# Altium footprint library PcbLib_ICs.PcbLib: 317 footprints (part 19 of 24)
Each footprint in its own frame and in the unit in brackets; x right, y up, seen from the top. Pads: shape width x height; smd on the part's side, far side on the other; paste and mask are expansions set on the pad; w line width, h text height; cw(c..) or ccw(c..) is an arc to the next point about the centre after c.
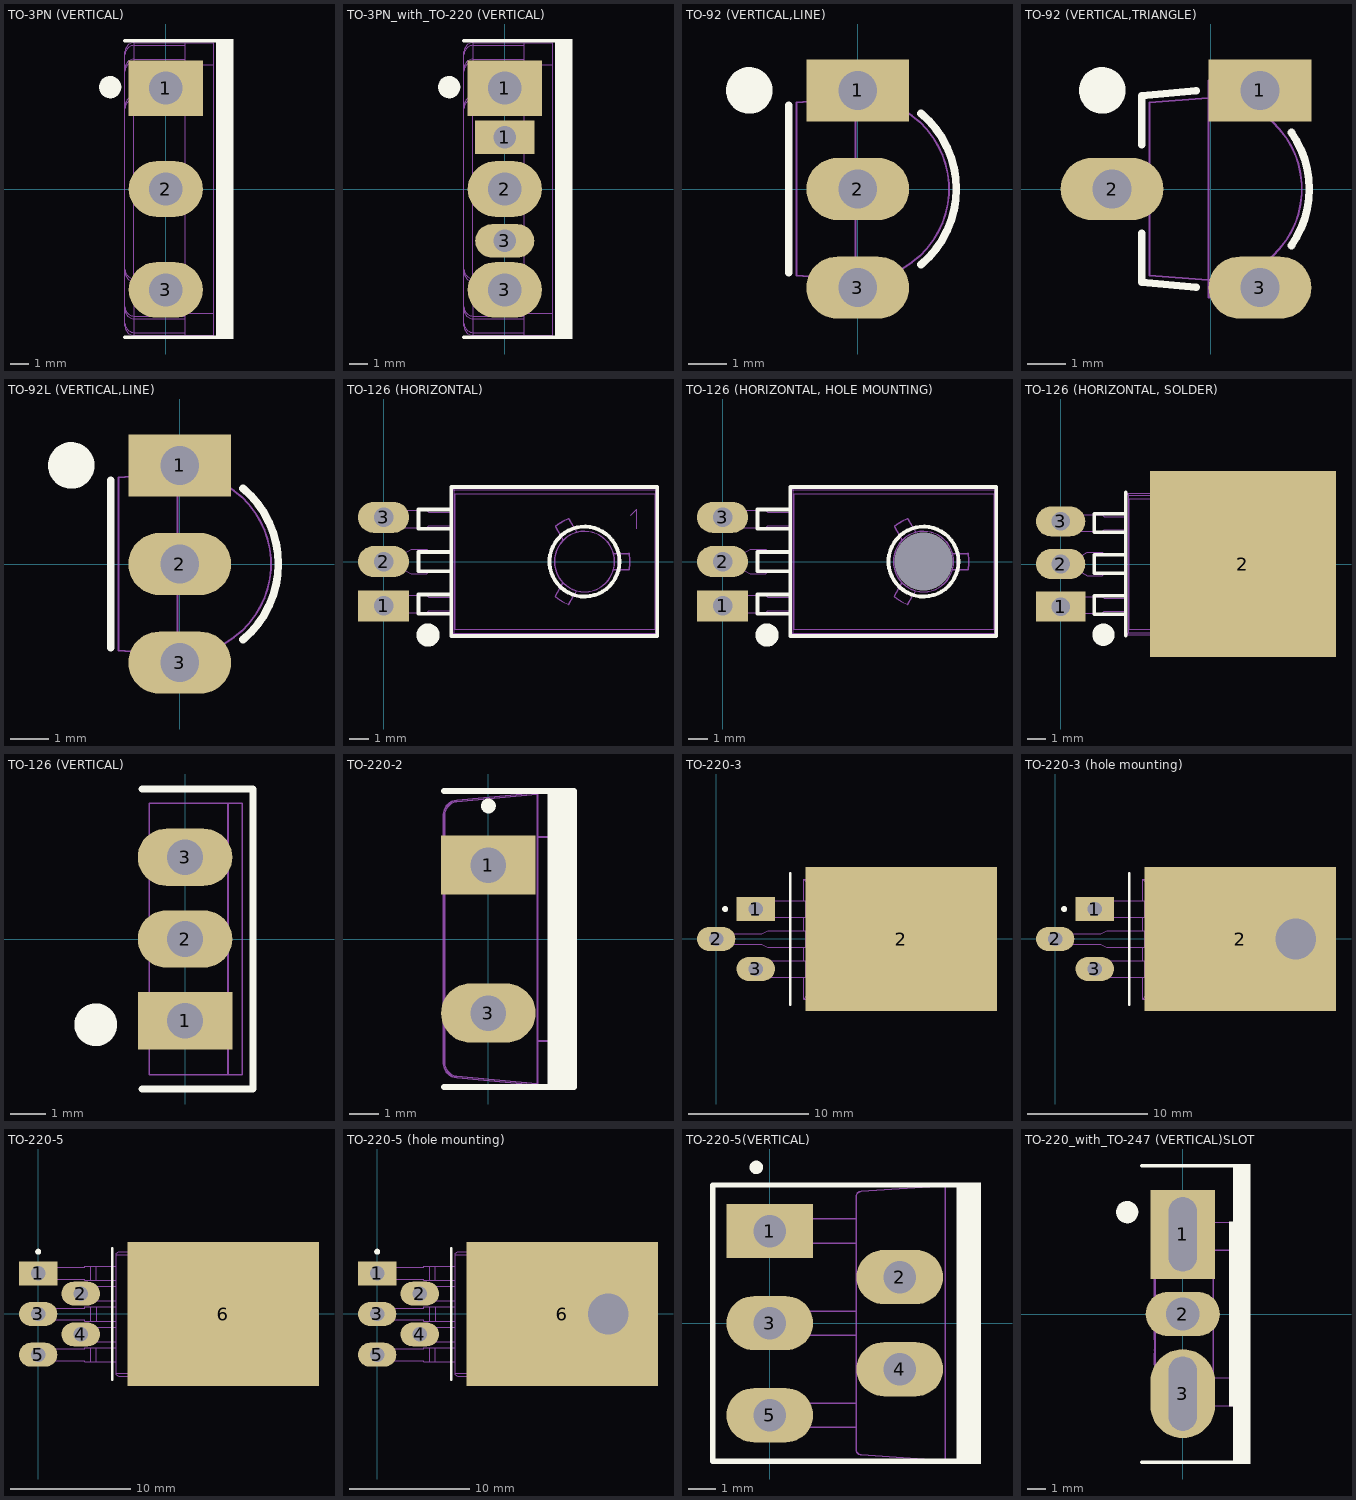
[diagram p18: the footprints below, top view; thin cyan lines are the x and y axes]

## TO-3PN (VERTICAL) [mm]
height 4.57
pads (3):
  rect 4x3 hole 1.8: 1(0,5.45)
  oval 4x3 hole 1.8: 2(0,0) 3(0,-5.45)
Top Overlay:
  circle w0.6: c-3,5.5 r0.3
  rectangle: 2.8,-8.1 3.65,8.1
  lines w0.2: -2.2,-8 2.8,-8 2.8,8 -2.2,8
Top Assy:
  lines w0.05: -2.201,-7.249 ccw(c-1.701,-7.249) -1.701,-7.749 ; -2.201,-6.506 ccw(c-1.701,-6.506) -1.701,-7.006 ; -2.201,-6.364 ccw(c-1.701,-6.364) -1.701,-6.864 ; -2.201,-4.484 ccw(c-1.701,-4.484) -1.701,-4.984 ; -2.201,-4.342 ccw(c-1.701,-4.342) -1.701,-4.842 ; -2.201,4.344 cw(c-1.701,4.344) -1.701,4.844 ; -2.201,4.486 cw(c-1.701,4.486) -1.701,4.986 ; -2.201,6.358 cw(c-1.701,6.358) -1.701,6.858 ; -2.201,6.508 cw(c-1.701,6.508) -1.701,7.008 ; -2.201,7.251 cw(c-1.701,7.251) -1.701,7.751 ; -1.727,-4.983 cw(c-0.408,-4.912) -1.727,-4.842 -1.727,4.844 cw(c-0.408,4.914) -1.727,4.985 ; 1.049,-7.749 -1.701,-7.749 ; 1.049,-7.006 -1.701,-7.006 ; 1.049,-6.864 -1.701,-6.864 ; 1.049,-4.934 -1.701,-4.984 ; 1.049,-4.792 -1.709,-4.842 ccw(c-0.384,-4.84) -1.701,-4.984 ; 1.049,4.794 -1.709,4.844 cw(c-0.384,4.842) -1.701,4.986 ; 1.049,4.936 -1.701,4.986 ; 1.049,6.866 -1.701,6.866 ; 1.049,7.008 -1.701,7.008 ; 1.049,7.751 -1.701,7.751 ; 2.599,-7.898 2.6,-7.898 2.6,-6.799 ; 2.599,-6.799 2.6,-6.799 ; 2.599,-3.499 2.6,-3.499 ; 2.599,3.501 2.6,3.501 ; 2.599,6.801 2.6,6.801 ; 2.599,7.9 2.6,7.9 2.6,6.801 ; -1.701,-7.899 cw(c-1.701,-7.399) -2.201,-7.399 -2.201,-6.543 -2.201,-4.592 -2.201,4.594 -2.201,6.545 -2.201,7.401 cw(c-1.701,7.401) -1.701,7.901 ; -1.701,-7.899 1.049,-7.899 ; -1.701,-7.899 -1.701,-7.749 ; -1.701,-7.749 -1.701,-7.006 ; -1.701,-7.006 -1.701,-6.864 ; -1.701,-6.864 -1.701,-4.984 ; -1.701,4.986 -1.701,6.866 ; -1.701,6.866 -1.701,7.008 ; -1.701,7.008 -1.701,7.751 ; -1.701,7.751 -1.701,7.901 ; -1.701,7.901 1.049,7.901 ; 1.049,-7.899 1.049,-6.699 ; 1.049,-7.899 2.599,-7.899 2.599,-6.699 ; 1.049,-6.699 1.049,6.701 ; 1.049,-6.699 2.599,-6.699 ; 1.049,6.701 1.049,7.901 ; 1.049,6.701 2.599,6.701 ; 1.049,7.901 2.599,7.901 2.599,6.701 ; 2.599,-6.699 2.599,6.701 ; 2.6,-6.799 2.6,-3.499 ; 2.6,-3.499 2.6,3.501 ; 2.6,3.501 2.6,6.801
  text ".Designator" at -4.2,5.162 h3
3D body "TO-3PN_2.STEP": height 29.9, standoff -3.5, extent -2.2,-7.9 2.601,7.9

## TO-3PN_with_TO-220 (VERTICAL) [mm]
height 4.57
pads (5):
  rect 3.2x1.8 hole 1.2: 1(0,2.8)
  rect 4x3 hole 1.8: 1(0,5.45)
  oval 4x3 hole 1.8: 2(0,0) 3(0,-5.45)
  oval 3.2x1.8 hole 1.2: 3(0,-2.8)
Top Overlay:
  circle w0.6: c-3,5.5 r0.3
  rectangle: 2.8,-8.1 3.65,8.1
  lines w0.2: -2.2,-8 2.8,-8 2.8,8 -2.2,8
Top Assy:
  lines w0.05: -2.201,-7.249 ccw(c-1.701,-7.249) -1.701,-7.749 ; -2.201,-6.506 ccw(c-1.701,-6.506) -1.701,-7.006 ; -2.201,-6.364 ccw(c-1.701,-6.364) -1.701,-6.864 ; -2.201,-4.484 ccw(c-1.701,-4.484) -1.701,-4.984 ; -2.201,-4.342 ccw(c-1.701,-4.342) -1.701,-4.842 ; -2.201,4.344 cw(c-1.701,4.344) -1.701,4.844 ; -2.201,4.486 cw(c-1.701,4.486) -1.701,4.986 ; -2.201,6.358 cw(c-1.701,6.358) -1.701,6.858 ; -2.201,6.508 cw(c-1.701,6.508) -1.701,7.008 ; -2.201,7.251 cw(c-1.701,7.251) -1.701,7.751 ; -1.727,-4.983 cw(c-0.408,-4.912) -1.727,-4.842 -1.727,4.844 cw(c-0.408,4.914) -1.727,4.985 ; 1.049,-7.749 -1.701,-7.749 ; 1.049,-7.006 -1.701,-7.006 ; 1.049,-6.864 -1.701,-6.864 ; 1.049,-4.934 -1.701,-4.984 ; 1.049,-4.792 -1.709,-4.842 ccw(c-0.384,-4.84) -1.701,-4.984 ; 1.049,4.794 -1.709,4.844 cw(c-0.384,4.842) -1.701,4.986 ; 1.049,4.936 -1.701,4.986 ; 1.049,6.866 -1.701,6.866 ; 1.049,7.008 -1.701,7.008 ; 1.049,7.751 -1.701,7.751 ; 2.599,-7.898 2.6,-7.898 2.6,-6.799 ; 2.599,-6.799 2.6,-6.799 ; 2.599,-3.499 2.6,-3.499 ; 2.599,3.501 2.6,3.501 ; 2.599,6.801 2.6,6.801 ; 2.599,7.9 2.6,7.9 2.6,6.801 ; -1.701,-7.899 cw(c-1.701,-7.399) -2.201,-7.399 -2.201,-6.543 -2.201,-4.592 -2.201,4.594 -2.201,6.545 -2.201,7.401 cw(c-1.701,7.401) -1.701,7.901 ; -1.701,-7.899 -1.701,-7.749 ; -1.701,-7.899 1.049,-7.899 ; -1.701,-7.749 -1.701,-7.006 ; -1.701,-7.006 -1.701,-6.864 ; -1.701,-6.864 -1.701,-4.984 ; -1.701,4.986 -1.701,6.866 ; -1.701,6.866 -1.701,7.008 ; -1.701,7.008 -1.701,7.751 ; -1.701,7.751 -1.701,7.901 ; -1.701,7.901 1.049,7.901 ; 1.049,-7.899 2.599,-7.899 2.599,-6.699 ; 1.049,-7.899 1.049,-6.699 ; 1.049,-6.699 2.599,-6.699 ; 1.049,-6.699 1.049,6.701 ; 1.049,6.701 2.599,6.701 ; 1.049,6.701 1.049,7.901 ; 1.049,7.901 2.599,7.901 2.599,6.701 ; 2.599,-6.699 2.599,6.701 ; 2.6,-6.799 2.6,-3.499 ; 2.6,-3.499 2.6,3.501 ; 2.6,3.501 2.6,6.801
  text ".Designator" at -4.2,5.162 h3
3D body "TO-3PN_2.STEP": height 29.9, standoff -3.5, extent -2.2,-7.9 2.601,7.9

## TO-92 (VERTICAL,LINE) [mm]
height 4.57
pads (3):
  rect 2.65x1.6 hole 1: 1(0,2.54)
  oval 2.65x1.6 hole 1: 2(0,0) 3(0,-2.54)
Top Overlay:
  circle w0.6: c-2.794,2.54 r0.3
  lines w0.2: -1.778,-2.159 -1.778,2.159 ; 1.633,-1.946 ccw(c0,0) 1.633,1.946
Top Assy:
  lines w0.05: 0.421,-2.313 0.421,-2.613 ; 0.421,2.313 0.421,2.616 ; -0.059,-2.613 0.421,-2.613 ; -0.059,-2.613 -0.059,-2.795 0.421,-2.795 0.421,-2.613 ; -0.059,-2.613 -0.059,-2.35 ; -0.059,-2.35 ccw(c0,0) -0.059,2.35 ; -0.059,-2.35 -1.579,-2.225 -1.579,2.225 -0.059,2.35 ; -0.059,-2.35 -0.059,2.35 ; -0.059,2.35 -0.059,2.616 ; -0.059,2.616 0.421,2.616 ; -0.059,2.616 -0.059,2.802 0.421,2.802 0.421,2.616
  text ".Designator" at -2.348,-5.162 h3
3D body "User Library-TO-92-2_54-line.STEP": height 10.2, standoff -2.2, extent -1.805,-2.798 2.125,2.798

## TO-92 (VERTICAL,TRIANGLE) [mm]
height 4.57
pads (3):
  rect 2.65x1.6 hole 1: 1(1.27,2.54)
  oval 2.65x1.6 hole 1: 2(-2.54,0) 3(1.27,-2.54)
Top Overlay:
  circle w0.6: c-2.794,2.54 r0.3
  lines w0.2: -1.778,-1.143 -1.778,-2.401 -0.38,-2.529 ; -1.778,1.143 -1.778,2.401 -0.38,2.529 ; 2.081,-1.457 ccw(c0,0) 2.081,1.457
Top Assy:
  lines w0.05: 0.421,-2.313 0.421,-2.613 ; 0.421,2.313 0.421,2.616 ; -0.059,-2.613 0.421,-2.613 ; -0.059,-2.613 -0.059,-2.795 0.421,-2.795 0.421,-2.613 ; -0.059,-2.613 -0.059,-2.35 ; -0.059,-2.35 ccw(c0,0) -0.059,2.35 ; -0.059,-2.35 -1.579,-2.225 -1.579,2.225 -0.059,2.35 ; -0.059,-2.35 -0.059,2.35 ; -0.059,2.35 -0.059,2.616 ; -0.059,2.616 0.421,2.616 ; -0.059,2.616 -0.059,2.802 0.421,2.802 0.421,2.616
  text ".Designator" at 4.764,-5.162 h3
3D body "User Library-TO-92-2_54-MIRR.STEP": height 10.2, standoff -2.2, extent -2.8,-2.795 1.66,2.795

## TO-92L (VERTICAL,LINE) [mm]
height 4.57
pads (3):
  rect 2.65x1.6 hole 1: 1(0,2.54)
  oval 2.65x1.6 hole 1: 2(0,0) 3(0,-2.54)
Top Overlay:
  circle w0.6: c-2.794,2.54 r0.3
  lines w0.2: -1.778,-2.159 -1.778,2.159 ; 1.633,-1.946 ccw(c0,0) 1.633,1.946
Top Assy:
  lines w0.05: 0.421,-2.313 0.421,-2.613 ; 0.421,2.313 0.421,2.616 ; -0.059,-2.613 -0.059,-2.35 ; -0.059,-2.613 -0.059,-2.795 0.421,-2.795 0.421,-2.613 ; -0.059,-2.613 0.421,-2.613 ; -0.059,-2.35 ccw(c0,0) -0.059,2.35 ; -0.059,-2.35 -0.059,2.35 ; -0.059,-2.35 -1.579,-2.225 -1.579,2.225 -0.059,2.35 ; -0.059,2.35 -0.059,2.616 ; -0.059,2.616 -0.059,2.802 0.421,2.802 0.421,2.616 ; -0.059,2.616 0.421,2.616
  text ".Designator" at -2.348,-5.162 h3
3D body "TO-92L.STEP": height 13, standoff -2, extent -1.2,-2.765 2.7,2.765

## TO-126 (HORIZONTAL) [mm]
height 4.57
pads (3):
  rect 2.65x1.6 hole 1: 1(0,-2.29)
  oval 2.65x1.6 hole 1: 2(0,0) 3(0,2.29)
Top Overlay:
  circle w0.6: c2.3,-3.8 r0.3
  circle w0.2: c10.39,0 r1.81
  lines w0.2: 3.5,-2.7 1.8,-2.7 1.8,-1.7 3.5,-1.7 ; 3.5,-0.5 1.8,-0.5 1.8,0.5 3.5,0.5 ; 3.5,1.7 1.8,1.7 1.8,2.7 3.5,2.7 ; 3.5,-3.85 14.15,-3.85 14.15,3.85 3.5,3.85 3.5,-3.85
Top Assy:
  lines w0.05: 8.894,-1.791 9.287,-1.11 ; 8.894,1.791 9.287,1.11 ; 8.899,-1.816 ccw(c10.39,0) 9.563,-2.199 ; 8.899,1.816 cw(c10.39,0) 9.563,2.2 ; 9.192,-1.275 ccw(c10.39,0) 9.885,-1.675 ; 9.192,1.276 cw(c10.39,0) 9.885,1.676 ; 9.285,-1.115 ccw(c10.39,0) 9.978,-1.515 ; 9.285,1.115 cw(c10.39,0) 9.978,1.515 ; 9.587,-2.191 9.98,-1.51 ; 9.587,2.191 9.98,1.51 ; 11.903,-0.4 12.689,-0.4 ; 11.903,0.4 12.689,0.4 ; 11.908,-0.4 ccw(c10.39,0) 11.908,0.4 ; 12.094,-0.4 ccw(c10.39,0) 12.094,0.4 ; 12.709,-0.383 ccw(c10.39,0) 12.709,0.383 ; 12.771,2.385 13.086,2.7 ; 13.085,1.7 13.086,1.7 13.086,2.71 ; 0.5,-2.6 -0.287,-2.6 -0.287,-1.8 0.5,-1.8 ; 0.5,-2.6 0.5,-1.8 ; 0.5,-2.6 1,-2.6 1.087,-2.65 2.24,-2.65 2.34,-2.55 3.54,-2.55 3.54,-1.85 2.34,-1.85 2.24,-1.75 1.087,-1.75 1,-1.8 0.5,-1.8 ; 0.5,-0.4 -0.287,-0.4 -0.287,0.4 0.5,0.4 ; 0.5,-0.4 0.5,0.4 ; 0.5,-0.4 1.026,-0.4 1.433,-0.635 2.24,-0.635 2.34,-0.535 3.54,-0.535 3.54,0.535 2.34,0.535 2.24,0.635 1.433,0.635 1.026,0.4 0.5,0.4 ; 0.5,1.8 -0.285,1.8 -0.285,2.6 0.5,2.6 ; 0.5,1.8 0.5,2.6 ; 0.5,1.8 1,1.8 1.087,1.75 2.24,1.75 2.34,1.85 3.54,1.85 3.54,2.55 2.34,2.55 2.24,2.65 1.087,2.65 1,2.6 0.5,2.6 ; 3.54,-3.78 ccw(c3.561,-3.78) 3.56,-3.8 ; 3.54,-3.78 3.54,3.78 ; 3.54,-3.78 3.636,-3.684 3.65,-3.67 3.65,-3.505 3.65,3.505 3.65,3.67 3.636,3.685 3.54,3.78 ; 3.54,-3.78 3.54,3.78 ; 3.54,3.78 cw(c3.561,3.78) 3.56,3.8 ; 3.56,-3.8 14.17,-3.8 ; 3.56,-3.8 3.656,-3.704 14.075,-3.704 14.17,-3.8 ; 3.56,-3.8 14.17,-3.8 ; 3.56,3.8 14.17,3.8 ; 3.56,3.8 3.656,3.705 14.075,3.705 14.17,3.8 ; 3.56,3.8 14.17,3.8 ; 14.17,-3.8 ccw(c14.17,-3.78) 14.19,-3.78 ; 14.17,3.8 cw(c14.17,3.78) 14.19,3.78 ; 14.19,-3.78 14.095,-3.684 14.08,-3.67 14.08,-3.505 14.08,3.505 14.08,3.67 14.095,3.685 14.19,3.78 ; 14.19,-3.78 14.19,3.78 ; 14.19,-3.78 14.19,3.78 ; 3.67,-3.505 3.67,3.505 14.06,3.505 14.06,-3.505 3.67,-3.505 ; 8.877,-1.781 ccw(c8.912,-1.801) 8.886,-1.832 ccw(c10.39,0) 9.556,-2.218 ccw(c9.57,-2.181) 9.605,-2.201 9.998,-1.52 ccw(c10.39,0) 11.903,-0.42 12.689,-0.42 ccw(c12.689,-0.38) 12.729,-0.386 ccw(c10.39,0) 12.729,0.387 ccw(c12.689,0.38) 12.689,0.42 11.903,0.42 ccw(c10.39,0) 9.998,1.52 9.605,2.201 ccw(c9.57,2.181) 9.556,2.218 ccw(c10.39,0) 8.886,1.832 ccw(c8.912,1.801) 8.877,1.781 9.27,1.1 ccw(c10.39,0) 9.27,-1.1 8.877,-1.781 ; 9.284,-1.086 ccw(c10.39,0) 10.003,-1.501 ccw(c10.39,0) 11.884,-0.415 ccw(c10.39,0) 11.884,0.415 ccw(c10.39,0) 10.003,1.501 ccw(c10.39,0) 9.284,1.086 ccw(c10.39,0) 9.284,-1.086
  text ".Designator" at 5.3,5.162 h3
3D body "User Library-TO-126 (SOT32) Grey PCB.STEP": height 2.7, standoff -2.37, extent -0.287,-3.8 14.19,3.8

## TO-126 (HORIZONTAL, HOLE MOUNTING) [mm]
height 4.57
pads (4):
  rect 2.65x1.6 hole 1: 1(0,-2.29)
  oval 2.65x1.6 hole 1: 2(0,0) 3(0,2.29)
  round 0 hole 3 unplated: M1(10.39,0)
Top Overlay:
  circle w0.2: c10.39,0 r1.81
  circle w0.6: c2.3,-3.8 r0.3
  lines w0.2: 3.5,-2.7 1.8,-2.7 1.8,-1.7 3.5,-1.7 ; 3.5,-0.5 1.8,-0.5 1.8,0.5 3.5,0.5 ; 3.5,1.7 1.8,1.7 1.8,2.7 3.5,2.7 ; 3.5,-3.85 14.15,-3.85 14.15,3.85 3.5,3.85 3.5,-3.85
Top Assy:
  lines w0.05: 8.894,-1.791 9.287,-1.11 ; 8.894,1.791 9.287,1.11 ; 8.899,-1.816 ccw(c10.39,0) 9.563,-2.199 ; 8.899,1.816 cw(c10.39,0) 9.563,2.2 ; 9.192,-1.275 ccw(c10.39,0) 9.885,-1.675 ; 9.192,1.276 cw(c10.39,0) 9.885,1.676 ; 9.285,-1.115 ccw(c10.39,0) 9.978,-1.515 ; 9.285,1.115 cw(c10.39,0) 9.978,1.515 ; 9.587,-2.191 9.98,-1.51 ; 9.587,2.191 9.98,1.51 ; 11.903,-0.4 12.689,-0.4 ; 11.903,0.4 12.689,0.4 ; 11.908,-0.4 ccw(c10.39,0) 11.908,0.4 ; 12.094,-0.4 ccw(c10.39,0) 12.094,0.4 ; 12.709,-0.383 ccw(c10.39,0) 12.709,0.383 ; 0.5,-2.6 1,-2.6 1.087,-2.65 2.24,-2.65 2.34,-2.55 3.54,-2.55 3.54,-1.85 2.34,-1.85 2.24,-1.75 1.087,-1.75 1,-1.8 0.5,-1.8 ; 0.5,-2.6 0.5,-1.8 ; 0.5,-2.6 -0.287,-2.6 -0.287,-1.8 0.5,-1.8 ; 0.5,-0.4 1.026,-0.4 1.433,-0.635 2.24,-0.635 2.34,-0.535 3.54,-0.535 3.54,0.535 2.34,0.535 2.24,0.635 1.433,0.635 1.026,0.4 0.5,0.4 ; 0.5,-0.4 0.5,0.4 ; 0.5,-0.4 -0.287,-0.4 -0.287,0.4 0.5,0.4 ; 0.5,1.8 1,1.8 1.087,1.75 2.24,1.75 2.34,1.85 3.54,1.85 3.54,2.55 2.34,2.55 2.24,2.65 1.087,2.65 1,2.6 0.5,2.6 ; 0.5,1.8 0.5,2.6 ; 0.5,1.8 -0.285,1.8 -0.285,2.6 0.5,2.6 ; 3.54,-3.78 ccw(c3.561,-3.78) 3.56,-3.8 ; 3.54,-3.78 3.54,3.78 ; 3.54,-3.78 3.636,-3.684 3.65,-3.67 3.65,-3.505 3.65,3.505 3.65,3.67 3.636,3.685 3.54,3.78 ; 3.54,-3.78 3.54,3.78 ; 3.54,3.78 cw(c3.561,3.78) 3.56,3.8 ; 3.56,-3.8 14.17,-3.8 ; 3.56,-3.8 3.656,-3.704 14.075,-3.704 14.17,-3.8 ; 3.56,-3.8 14.17,-3.8 ; 3.56,3.8 14.17,3.8 ; 3.56,3.8 3.656,3.705 14.075,3.705 14.17,3.8 ; 3.56,3.8 14.17,3.8 ; 14.17,-3.8 ccw(c14.17,-3.78) 14.19,-3.78 ; 14.17,3.8 cw(c14.17,3.78) 14.19,3.78 ; 14.19,-3.78 14.19,3.78 ; 14.19,-3.78 14.19,3.78 ; 14.19,-3.78 14.095,-3.684 14.08,-3.67 14.08,-3.505 14.08,3.505 14.08,3.67 14.095,3.685 14.19,3.78 ; 3.67,-3.505 14.06,-3.505 14.06,3.505 3.67,3.505 3.67,-3.505 ; 8.877,-1.781 ccw(c8.912,-1.801) 8.886,-1.832 ccw(c10.39,0) 9.556,-2.218 ccw(c9.57,-2.181) 9.605,-2.201 9.998,-1.52 ccw(c10.39,0) 11.903,-0.42 12.689,-0.42 ccw(c12.689,-0.38) 12.729,-0.386 ccw(c10.39,0) 12.729,0.387 ccw(c12.689,0.38) 12.689,0.42 11.903,0.42 ccw(c10.39,0) 9.998,1.52 9.605,2.201 ccw(c9.57,2.181) 9.556,2.218 ccw(c10.39,0) 8.886,1.832 ccw(c8.912,1.801) 8.877,1.781 9.27,1.1 ccw(c10.39,0) 9.27,-1.1 8.877,-1.781 ; 9.284,-1.086 cw(c10.39,0) 9.284,1.086 cw(c10.39,0) 10.003,1.501 cw(c10.39,0) 11.884,0.415 cw(c10.39,0) 11.884,-0.415 cw(c10.39,0) 10.003,-1.501 cw(c10.39,0) 9.284,-1.086
  text ".Designator" at 5.3,5.162 h3
3D body "User Library-TO-126 (SOT32) Grey PCB.STEP": height 2.7, standoff -2.37, extent -0.287,-3.8 14.19,3.8

## TO-126 (HORIZONTAL, SOLDER) [mm]
height 4.57
pads (4):
  rect 2.65x1.6 hole 1: 1(0,-2.29)
  oval 2.65x1.6 hole 1: 2(0,0) 3(0,2.29)
  rect 10x10 smd paste-10: 2(9.8,0)
Top Overlay:
  circle w0.6: c2.3,-3.8 r0.3
  lines w0.2: 3.5,-3.85 3.5,3.85 ; 3.5,-2.7 1.8,-2.7 1.8,-1.7 3.5,-1.7 ; 3.5,-0.5 1.8,-0.5 1.8,0.5 3.5,0.5 ; 3.5,1.7 1.8,1.7 1.8,2.7 3.5,2.7
Top Paste:
  rectangle: 6.244,-2.8 7.244,-1.8
  rectangle: 6.244,-1.65 7.244,-0.65
  rectangle: 6.244,-0.5 7.244,0.5
  rectangle: 6.244,0.65 7.244,1.65
  rectangle: 6.244,1.8 7.244,2.8
  rectangle: 7.478,1.8 8.478,2.8
  rectangle: 7.478,0.65 8.478,1.65
  rectangle: 7.478,-0.5 8.478,0.5
  rectangle: 7.478,-1.65 8.478,-0.65
  rectangle: 7.478,-2.8 8.478,-1.8
  rectangle: 8.711,1.8 9.711,2.8
  rectangle: 8.711,0.65 9.711,1.65
  rectangle: 8.711,-0.5 9.711,0.5
  rectangle: 8.711,-1.65 9.711,-0.65
  rectangle: 8.711,-2.8 9.711,-1.8
  rectangle: 9.944,1.8 10.944,2.8
  rectangle: 9.944,0.65 10.944,1.65
  rectangle: 9.944,-0.5 10.944,0.5
  rectangle: 9.944,-1.65 10.944,-0.65
  rectangle: 9.944,-2.8 10.944,-1.8
  rectangle: 11.178,1.8 12.178,2.8
  rectangle: 11.178,0.65 12.178,1.65
  rectangle: 11.178,-0.5 12.178,0.5
  rectangle: 11.178,-1.65 12.178,-0.65
  rectangle: 11.178,-2.8 12.178,-1.8
  rectangle: 12.411,1.8 13.411,2.8
  rectangle: 12.411,0.65 13.411,1.65
  rectangle: 12.411,-0.5 13.411,0.5
  rectangle: 12.411,-1.65 13.411,-0.65
  rectangle: 12.411,-2.8 13.411,-1.8
Top Assy:
  lines w0.05: 8.894,-1.791 9.287,-1.11 ; 8.894,1.791 9.287,1.11 ; 8.899,-1.816 ccw(c10.39,0) 9.563,-2.199 ; 8.899,1.816 cw(c10.39,0) 9.563,2.2 ; 9.192,-1.275 ccw(c10.39,0) 9.885,-1.675 ; 9.192,1.276 cw(c10.39,0) 9.885,1.676 ; 9.285,-1.115 ccw(c10.39,0) 9.978,-1.515 ; 9.285,1.115 cw(c10.39,0) 9.978,1.515 ; 9.587,-2.191 9.98,-1.51 ; 9.587,2.191 9.98,1.51 ; 11.903,-0.4 12.689,-0.4 ; 11.903,0.4 12.689,0.4 ; 11.908,-0.4 ccw(c10.39,0) 11.908,0.4 ; 12.094,-0.4 ccw(c10.39,0) 12.094,0.4 ; 12.709,-0.383 ccw(c10.39,0) 12.709,0.383 ; 12.771,2.385 13.086,2.7 ; 13.085,1.7 13.086,1.7 13.086,2.71 ; 0.5,-2.6 -0.287,-2.6 -0.287,-1.8 0.5,-1.8 ; 0.5,-2.6 0.5,-1.8 ; 0.5,-2.6 1,-2.6 1.087,-2.65 2.24,-2.65 2.34,-2.55 3.54,-2.55 3.54,-1.85 2.34,-1.85 2.24,-1.75 1.087,-1.75 1,-1.8 0.5,-1.8 ; 0.5,-0.4 -0.287,-0.4 -0.287,0.4 0.5,0.4 ; 0.5,-0.4 0.5,0.4 ; 0.5,-0.4 1.026,-0.4 1.433,-0.635 2.24,-0.635 2.34,-0.535 3.54,-0.535 3.54,0.535 2.34,0.535 2.24,0.635 1.433,0.635 1.026,0.4 0.5,0.4 ; 0.5,1.8 -0.285,1.8 -0.285,2.6 0.5,2.6 ; 0.5,1.8 0.5,2.6 ; 0.5,1.8 1,1.8 1.087,1.75 2.24,1.75 2.34,1.85 3.54,1.85 3.54,2.55 2.34,2.55 2.24,2.65 1.087,2.65 1,2.6 0.5,2.6 ; 3.54,-3.78 ccw(c3.561,-3.78) 3.56,-3.8 ; 3.54,-3.78 3.54,3.78 ; 3.54,-3.78 3.636,-3.684 3.65,-3.67 3.65,-3.505 3.65,3.505 3.65,3.67 3.636,3.685 3.54,3.78 ; 3.54,-3.78 3.54,3.78 ; 3.54,3.78 cw(c3.561,3.78) 3.56,3.8 ; 3.56,-3.8 14.17,-3.8 ; 3.56,-3.8 3.656,-3.704 14.075,-3.704 14.17,-3.8 ; 3.56,-3.8 14.17,-3.8 ; 3.56,3.8 14.17,3.8 ; 3.56,3.8 3.656,3.705 14.075,3.705 14.17,3.8 ; 3.56,3.8 14.17,3.8 ; 14.17,-3.8 ccw(c14.17,-3.78) 14.19,-3.78 ; 14.17,3.8 cw(c14.17,3.78) 14.19,3.78 ; 14.19,-3.78 14.095,-3.684 14.08,-3.67 14.08,-3.505 14.08,3.505 14.08,3.67 14.095,3.685 14.19,3.78 ; 14.19,-3.78 14.19,3.78 ; 14.19,-3.78 14.19,3.78 ; 3.67,-3.505 3.67,3.505 14.06,3.505 14.06,-3.505 3.67,-3.505 ; 8.877,-1.781 ccw(c8.912,-1.801) 8.886,-1.832 ccw(c10.39,0) 9.556,-2.218 ccw(c9.57,-2.181) 9.605,-2.201 9.998,-1.52 ccw(c10.39,0) 11.903,-0.42 12.689,-0.42 ccw(c12.689,-0.38) 12.729,-0.386 ccw(c10.39,0) 12.729,0.387 ccw(c12.689,0.38) 12.689,0.42 11.903,0.42 ccw(c10.39,0) 9.998,1.52 9.605,2.201 ccw(c9.57,2.181) 9.556,2.218 ccw(c10.39,0) 8.886,1.832 ccw(c8.912,1.801) 8.877,1.781 9.27,1.1 ccw(c10.39,0) 9.27,-1.1 8.877,-1.781 ; 9.284,-1.086 ccw(c10.39,0) 10.003,-1.501 ccw(c10.39,0) 11.884,-0.415 ccw(c10.39,0) 11.884,0.415 ccw(c10.39,0) 10.003,1.501 ccw(c10.39,0) 9.284,1.086 ccw(c10.39,0) 9.284,-1.086
  text ".Designator" at 5.3,5.162 h3
3D body "User Library-TO-126 (SOT32) Grey PCB.STEP": height 2.7, standoff -2.37, extent -0.287,-3.8 14.19,3.8

## TO-126 (VERTICAL) [mm]
height 4.57
pads (3):
  rect 2.65x1.6 hole 1: 1(0,-2.29)
  oval 2.65x1.6 hole 1: 2(0,0) 3(0,2.29)
Top Overlay:
  circle w0.6: c-2.5,-2.4 r0.3
  lines w0.2: -1.2,-4.2 1.9,-4.2 1.9,2.5 1.9,4.2 -1.2,4.2
Top Assy:
  lines w0.05: 1.2,-3.8 1.2,3.8 ; -1,-3.8 -1,3.8 1.6,3.8 1.6,-3.8 -1,-3.8
  text ".Designator" at 2.3,5.162 h3
3D body "User Library-TO-126 (SOT32) V.step": height 13.49, standoff -3.24, extent -1,-3.8 1.55,3.8

## TO-220-2 [mm]
height 4.57
pads (2):
  rect 3.2x2 hole 1.2: 1(0,2.5)
  oval 3.2x2 hole 1.2: 3(0,-2.5)
Top Overlay:
  circle w0.25: c0,4.5 r0.125
  rectangle: 2,-5 2.9,5
  lines w0.2: -1.5,-5 2.9,-5 2.9,5 -1.5,5
Top Assy:
  lines w0.05: -1.53,-2.69 -1.53,-2.737 -1.52,-2.737 ; -1.53,-0.067 -1.53,0.003 ; -1.53,0.026 -1.53,0.003 ; -1.53,0.459 -1.53,0.455 -1.52,0.455 ; -1.53,0.468 -1.52,0.468 ; -1.53,0.591 -1.53,0.686 ; -1.53,1.238 -1.53,1.343 ; -1.53,1.689 -1.53,1.783 ; -1.53,2.348 -1.53,2.442 ; -1.53,3.006 -1.53,3.02 -1.52,3.02 ; -1.52,-2.673 -1.53,-2.673 -1.53,-2.473 ; -1.52,-2.473 -1.53,-2.473 ; -1.52,-2.269 -1.53,-2.269 ; -1.52,-2.109 -1.53,-2.109 -1.53,-2.269 ; -1.52,-1.961 -1.53,-1.961 -1.53,-1.94 ; -1.52,-1.94 -1.53,-1.94 ; -1.52,-1.393 -1.53,-1.393 ; -1.52,-1.391 -1.53,-1.391 ; -1.52,-1.281 -1.53,-1.281 ; -1.52,-0.735 -1.53,-0.735 ; -1.52,-0.623 -1.53,-0.623 ; -1.52,-0.076 -1.53,-0.076 -1.53,-0.623 ; -1.52,0.003 -1.53,0.003 ; -1.52,0.035 -1.53,0.035 -1.53,0.363 -1.52,0.363 ; -1.52,0.473 -1.53,0.473 -1.53,0.583 -1.52,0.583 ; -1.52,0.694 -1.53,0.694 -1.53,1.241 -1.52,1.241 ; -1.52,1.352 -1.53,1.352 -1.53,1.68 -1.52,1.68 ; -1.52,1.792 -1.53,1.792 -1.53,1.901 ; -1.52,1.901 -1.53,1.901 ; -1.52,2.339 -1.53,2.339 -1.53,1.901 ; -1.52,2.45 -1.53,2.45 -1.53,2.997 -1.52,2.997 ; -1.52,3.109 -1.53,3.109 -1.53,3.656 -1.52,3.656 ; 1.657,-4.894 -1.064,-4.639 ; 1.657,4.902 -1.064,4.647 ; 1.674,-4.946 -1.067,-4.689 ; 1.674,4.953 -1.067,4.696 ; -1.53,-2.473 -1.53,-2.269 ; -1.53,-1.94 -1.53,-1.393 ; -1.53,-1.393 -1.53,-1.391 ; -1.53,-1.391 -1.53,-1.281 ; -1.53,-1.281 -1.53,-0.735 ; -1.53,-0.735 -1.53,-0.623 ; -1.52,-4.191 ccw(c-1.02,-4.191) -1.067,-4.689 ; -1.52,-4.191 -1.52,4.198 ; -1.52,-4.191 -1.472,-4.191 ; -1.52,4.198 cw(c-1.02,4.198) -1.067,4.696 ; -1.52,4.198 -1.472,4.198 ; -1.472,-4.191 ccw(c-1.022,-4.191) -1.064,-4.639 ; -1.472,-4.191 -1.472,4.198 ; -1.472,4.198 cw(c-1.022,4.198) -1.064,4.647 ; -1.067,-4.689 cw(c-0.688,-4.687) -1.064,-4.639 ; -1.067,4.696 ccw(c-0.688,4.694) -1.064,4.647 ; 1.657,-4.926 ccw(c1.677,-4.926) 1.677,-4.946 ; 1.657,-4.926 ccw(c1.676,-4.924) 1.677,-4.943 ; 1.657,-4.926 1.657,-3.436 ; 1.657,-3.436 ccw(c1.676,-3.434) 1.677,-3.452 ; 1.657,-3.436 1.657,3.443 ; 1.657,-3.436 1.677,-3.436 ; 1.657,3.443 cw(c1.676,3.441) 1.677,3.46 ; 1.657,3.443 1.657,4.934 ; 1.657,3.443 1.677,3.443 ; 1.657,4.934 cw(c1.677,4.934) 1.677,4.954 ; 1.657,4.934 cw(c1.676,4.932) 1.677,4.95 ; 1.677,-4.946 2.907,-4.946 ; 1.677,-4.946 1.677,-4.943 ; 1.677,-4.943 1.677,-3.452 ; 1.677,-4.943 2.907,-4.943 ; 1.677,-3.452 1.677,-3.436 ; 1.677,-3.452 2.907,-3.452 ; 1.677,-3.436 1.677,3.443 ; 1.677,-3.436 2.907,-3.436 ; 1.677,3.443 2.907,3.443 ; 1.677,3.443 1.677,3.46 ; 1.677,3.46 2.907,3.46 ; 1.677,3.46 1.677,4.95 ; 1.677,4.95 2.907,4.95 ; 1.677,4.95 1.677,4.954 ; 1.677,4.954 2.907,4.954 ; 2.907,-4.946 ccw(c2.907,-4.926) 2.927,-4.926 ; 2.907,-4.946 2.927,-4.946 2.927,-4.926 ; 2.907,-4.946 2.907,-4.943 ; 2.907,-4.943 ccw(c2.909,-4.924) 2.927,-4.926 ; 2.907,-4.943 2.907,-3.452 ; 2.907,-3.452 ccw(c2.909,-3.434) 2.927,-3.436 ; 2.907,-3.452 2.907,-3.436 ; 2.907,-3.436 2.907,3.443 ; 2.907,-3.436 2.927,-3.436 ; 2.907,3.443 2.907,3.46 ; 2.907,3.443 2.927,3.443 ; 2.907,3.46 cw(c2.909,3.441) 2.927,3.443 ; 2.907,3.46 2.907,4.95 ; 2.907,4.95 cw(c2.909,4.932) 2.927,4.934 ; 2.907,4.95 2.907,4.954 ; 2.907,4.954 cw(c2.907,4.934) 2.927,4.934 ; 2.907,4.954 2.927,4.954 2.927,4.934 ; 2.927,-4.926 2.927,-3.436 ; 2.927,-3.436 2.927,3.443 ; 2.927,3.443 2.927,4.934